# Altium footprint library SparkFun.PCBLIB: 674 footprints (part 43 of 44)
Each footprint in its own frame and in the unit in brackets; x right, y up, seen from the top. Pads: shape width x height; smd on the part's side, far side on the other; paste and mask are expansions set on the pad; w line width, h text height; cw(c..) or ccw(c..) is an arc to the next point about the centre after c.
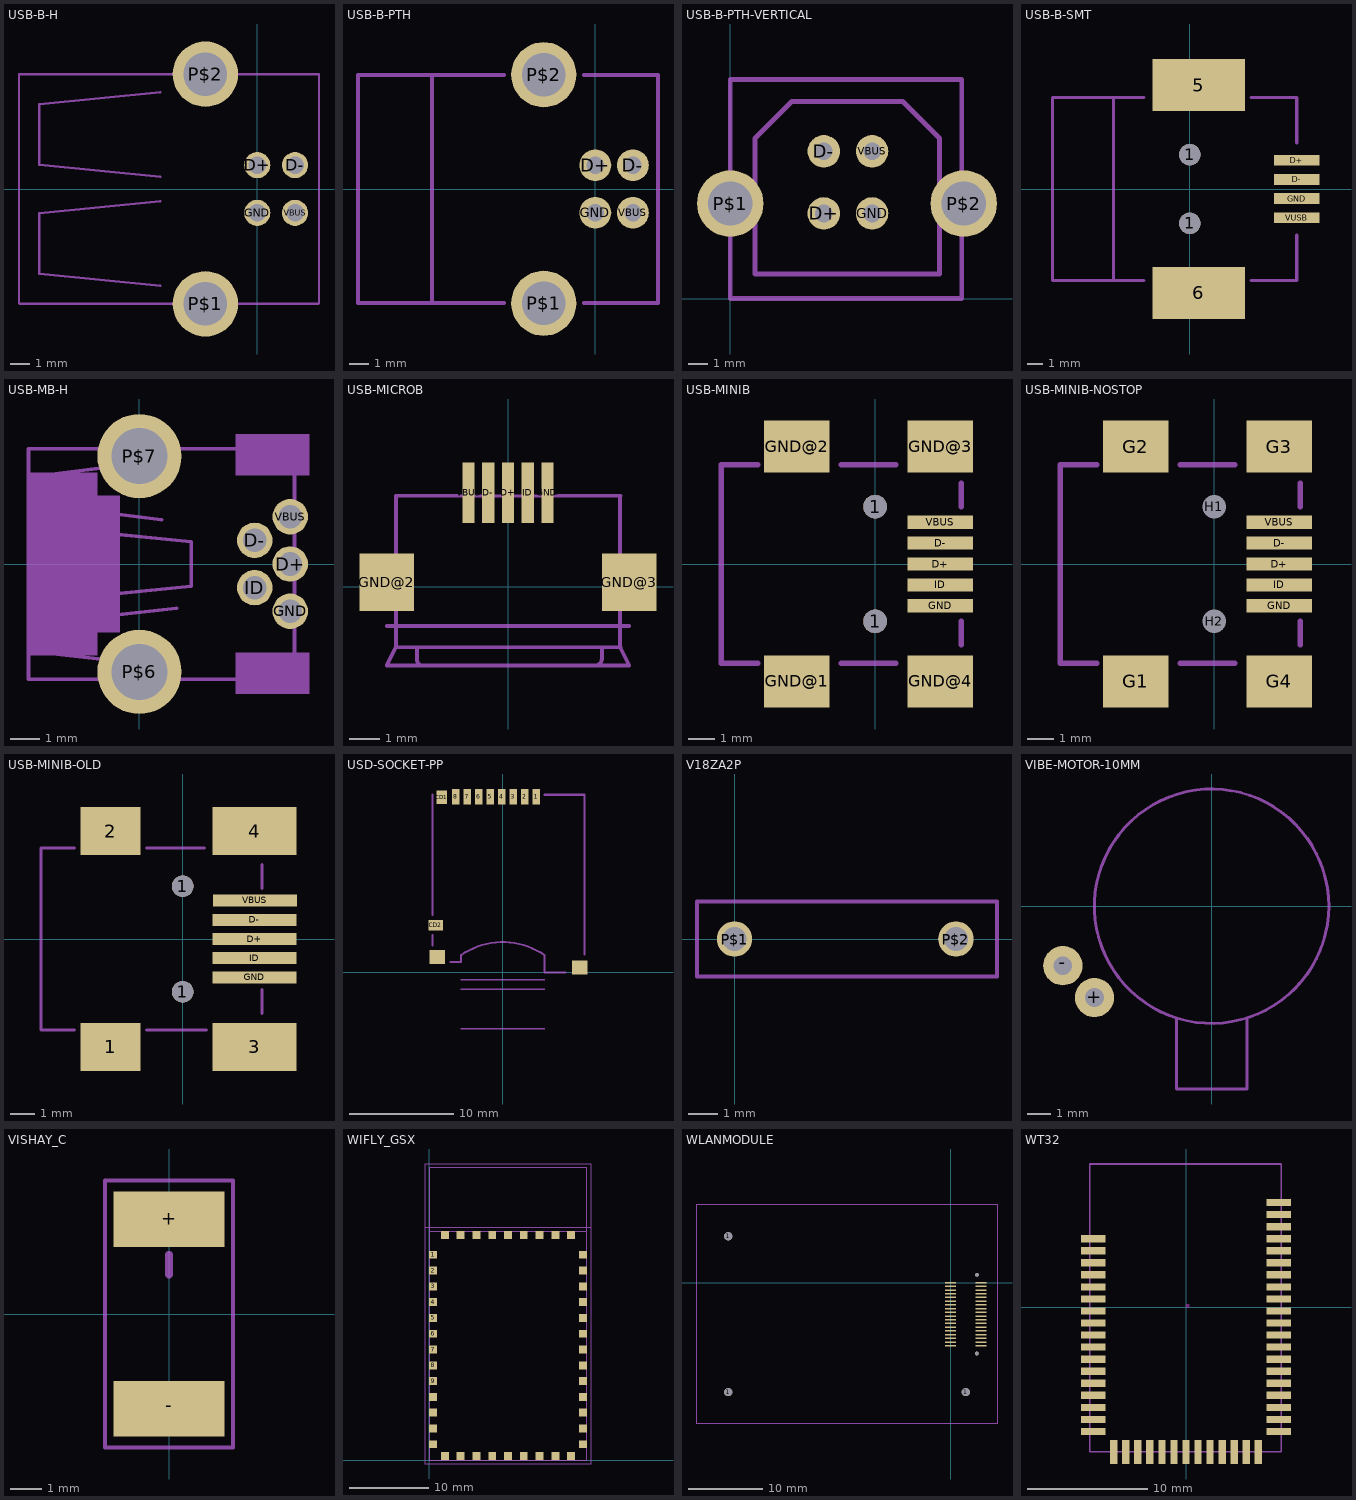
[diagram p42: the footprints below, top view; thin cyan lines are the x and y axes]

## USB-B-H [mil]
pads (6):
  round 54 hole 36: D+(0,49.21) D-(78,49.21) GND(0,-49.21) VBUS(78,-49.21)
  round 135 hole 90: P$1(-107,-237) P$2(-107,237)
Mechanical 2:
  lines w5: -491.57,-236.21 -491.57,236.79 ; -490.79,237 127.21,237 ; -489.79,-237 126.21,-237 ; -200,-200 -450,-175 -450,-50 -200,-25 ; -200,25 -450,50 -450,175 -200,200 ; 127.43,-236.21 127.43,236.79

## USB-B-PTH [mil]
pads (6):
  round 66 hole 36: D+(0,49.21) D-(78,49.21) GND(0,-49.21) VBUS(78,-49.21)
  round 135 hole 90: P$1(-107,-237) P$2(-107,237)
Mechanical 2:
  lines w8: -338.58,-236.22 -188.98,-236.22 ; -338.58,236.22 -188.98,236.22 ; -23.62,-236.22 129.92,-236.22 129.92,236.22 -23.62,236.22
Mechanical 18:
  lines w8: -492.13,-236.22 -338.58,-236.22 -338.58,236.22 -492.13,236.22 -492.13,-236.22

## USB-B-PTH-VERTICAL [mil]
pads (6):
  round 66 hole 36: D+(190,173) D-(190,299) GND(288,173) VBUS(288,299)
  round 135 hole 90: P$1(0,193) P$2(474,193)
Mechanical 2:
  lines w10: 0,0 470,0 470,445 0,445 0,0
Mechanical 18:
  lines w10: 50,50 425,50 425,325 350,400 125,400 50,325 50,50

## USB-B-SMT [mm]
pads (8):
  round 1.4 hole 1.4: 1(0,-2.25) 1(0,2.25)
  rect 6.04x3.4 smd: 5(0.58,6.8) 6(0.58,-6.8)
  rect 3x0.7 smd: D+(7,1.875) D-(7,0.625) GND(7,-0.625) VUSB(7,-1.875)
Mechanical 2:
  lines w0.203: -5,-6 -3,-6 ; -5,6 -3,6 ; 4,-6 7,-6 7,-3 ; 4,6 7,6 7,3
Mechanical 18:
  lines w0.203: -9,-6 -9,6 -5,6 -5,-6 -9,-6 ; -1,-7.3 -1,-6 2.4,-6 2.4,-7.3 2.2,-7.5 1.9,-7.5 1.4,-7 0,-7 -0.5,-7.5 -0.8,-7.5 -1,-7.3 ; -1,6 2.4,6 2.4,7.3 2.2,7.5 1.9,7.5 1.4,7 0,7 -0.5,7.5 -0.8,7.5 -1,7.3 -1,6

## USB-MB-H [mil]
pads (7):
  round 47.25 hole 31.5: D+(200.79,0) D-(153.54,31.5) GND(200.79,-62.99) ID(153.54,-31.5) VBUS(200.79,62.99)
  round 112.2 hole 74.8: P$6(0,-143.7) P$7(0,143.7)
Mechanical 3:
  lines w5: -127.95,-49.21 68.9,-29.53 68.9,29.53 -127.95,49.21 ; 29.53,59.06 -127.95,78.74 -127.95,118.11 29.53,137.8 ; 49.21,-137.8 -127.95,-118.11 -127.95,-78.74 49.21,-59.06 ; -147.64,-153.54 -147.64,153.54 206.69,153.54 206.69,-153.54 -147.64,-153.54
Mechanical 12:
  rectangle: 127.95,118.11 226.38,173.23
  rectangle: 127.95,-173.23 226.38,-118.11
  rectangle: -147.64,-122.05 -56.1,122.05
  rectangle: -56.1,-91.54 -25.59,91.54

## USB-MICROB [mm]
pads (7):
  rect 0.4x2 smd: D+(0,3.1) D-(-0.65,3.1) GND(1.3,3.1) ID(0.65,3.1) VBUS(-1.3,3.1)
  rect 1.8x1.9 smd: GND@2(-4,0.15) GND@3(4,0.15)
Mechanical 2:
  lines w0.127: -4,-2.595 -3.685,-1.965 ; -3.7,-0.97 -3.7,-2 -3,-2 ; -3.7,1.265 -3.7,3 -1.67,3 ; 0.025,-2.595 cw(c0.01,-2.585) 0,-2.6 ; 1.67,3 3.7,3 ; 3.69,-1.975 3.995,-2.595 ; 3.7,-0.97 3.7,-2 ; 3.7,1.27 3.7,3 ; 3.71,-1.995 3.7,-2 ; 3.71,3 3.7,3 ; -3,-2 3.1,-2 ; -3,-2 -3,-2.435 ccw(c-2.828,-2.428) -2.82,-2.6 0,-2.6 ; 0,-2.6 2.82,-2.6 ccw(c2.863,-2.362) 3.1,-2.405 3.1,-2 ; 3.1,-2 3.7,-2
Mechanical 18:
  lines w0.127: -4,-2.6 4,-2.6 ; -4,-1.3 4,-1.3 ; -3.7,-2 -3.7,3 3.7,2.985 ; 3.7,-2 3.7,3

## USB-MINIB [mm]
pads (11):
  round 0.9 hole 0.9: 1(0,-2.2) 1(0,2.2)
  rect 2.5x0.5 smd: D+(2.5,0) D-(2.5,0.8) GND(2.5,-1.6) ID(2.5,-0.8) VBUS(2.5,1.6)
  rect 2.5x2 smd: GND@1(-3,-4.5) GND@2(-3,4.5) GND@3(2.5,4.5) GND@4(2.5,-4.5)
Mechanical 2:
  lines w0.203: -1.3,-3.8 0.8,-3.8 ; -1.3,3.8 0.8,3.8 ; 3.3,-3.1 3.3,-2.2 ; 3.3,2.2 3.3,3.1
Mechanical 18:
  lines w0.203: -4.5,-3.8 -5.9,-3.8 -5.9,3.8 -4.5,3.8

## USB-MINIB-NOSTOP [mil]
pads (11):
  rect 98.43x19.69 smd: D+(98.43,0) D-(98.43,31.5) GND(98.43,-62.99) ID(98.43,-31.5) VBUS(98.43,62.99)
  rect 98.43x78.74 smd: G1(-118.11,-177.17) G2(-118.11,177.17) G3(98.43,177.17) G4(98.43,-177.17)
  round 31.5 hole 35.43: H1(0,86.61)
  round 31 hole 35.43: H2(0,-86.61)
Top Solder:
  circle w16.14: c0,86.61 r13.78
  circle w16.14: c0,-86.61 r13.78
Mechanical 2:
  lines w8: -51.18,-149.61 31.5,-149.61 ; -51.18,149.61 31.5,149.61 ; 129.92,-122.05 129.92,-86.61 ; 129.92,86.61 129.92,122.05
Mechanical 18:
  lines w8: -177.17,-149.61 -232.28,-149.61 -232.28,149.61 -177.17,149.61

## USB-MINIB-OLD [mm]
pads (11):
  rect 2.5x2 smd: 1(-3,-4.5) 2(-3,4.5)
  round 0.9 hole 0.9: 1(0,-2.2) 1(0,2.2)
  rect 3.5x2 smd: 3(3,-4.5) 4(3,4.5)
  rect 3.5x0.5 smd: D+(3,0) D-(3,0.8) GND(3,-1.6) ID(3,-0.8) VBUS(3.01,1.61)
Mechanical 2:
  lines w0.127: -1.5,-3.8 1,-3.8 ; -1.5,3.8 0.9,3.8 ; 3.3,-3.1 3.3,-2.1 ; 3.3,2.1 3.3,3.1
Mechanical 18:
  lines w0.127: -4.5,-3.8 -5.9,-3.8 -5.9,3.8 -4.5,3.8

## USD-SOCKET-PP [mm]
pads (12):
  rect 0.75x1.5 smd: 1(3.2,16.8) 2(2.1,16.8) 3(1,16.8) 4(-0.1,16.8) 5(-1.2,16.8) 6(-2.3,16.8) 7(-3.4,16.8) 8(-4.5,16.8)
  rect 1x1.3 smd: CD1(-5.85,16.75)
  rect 1.4x1 smd: CD2(-6.425,4.5)
  rect 1.5x1.35 smd: GND1(-6.275,1.475) GND2(7.375,0.475)
Mechanical 2:
  lines w0.203: -6.725,2.6 -6.725,3.6 ; -6.725,5.5 -6.725,17 ; -5,1 -4,1 -4,1.65 cw(c0,-4.125) 4,1.65 4,0 6,0 ; 4,17 7.825,17 7.825,1.7
Mechanical 18:
  lines w0.127: -4,-5.4 4,-5.4 ; -4,-1.6 4,-1.6 ; -4,-0.7 4,-0.7

## V18ZA2P [mil]
pads (2):
  round 47.25 hole 31.5: P$1(0,0) P$2(295.28,0)
Mechanical 2:
  lines w5: -50,-50 -50,50 350,50 350,-50 -50,-50

## VIBE-MOTOR-10MM [mil]
pads (2):
  round 66 hole 31.5: +(-196.85,-153.54) -(-250,-100)
Mechanical 18:
  circle w5: c0,0 r196.89
  lines w5: -59.06,-188.98 -59.06,-307.09 59.06,-307.09 59.06,-188.98

## VISHAY_C [mil]
pads (2):
  rect 140x70 smd: +(0,120) -(0,-120)
Mechanical 2:
  lines w5: -81,-169 -81,169 81,169 81,-169 -81,-169
  lines w10: 0,50 0,75

## WIFLY_GSX [mm]
pads (44):
  rect 1x1 smd: 1(0.5,26) 2(0.5,24) 3(0.5,22) 4(0.5,20) 5(0.5,18) 6(0.5,16) 7(0.5,14) 8(0.5,12) 9(0.5,10) 10(0.5,8) 11(0.5,6) 12(0.5,4) 13(0.5,2) 14(2,0.5) 15(4,0.5) 16(6,0.5) 17(8,0.5) 18(10,0.5) 19(12,0.5) 20(14,0.5) 21(16,0.5) 22(18,0.5) 23(19.5,2) 24(19.5,4) 25(19.5,6) 26(19.5,8) 27(19.5,10) 28(19.5,12) 29(19.5,14) 30(19.5,16) 31(19.5,18) 32(19.5,20) 33(19.5,22) 34(19.5,24) 35(19.5,26) 36(18,28.5) 37(16,28.5) 38(14,28.5) 39(12,28.5) 40(10,28.5) 41(8,28.5) 42(6,28.5) 43(4,28.5) 44(2,28.5)
Mechanical 2:
  lines w0.127: -0.5,29.5 -0.5,-0.5 20.5,-0.5 20.5,29.5 ; -0.5,29.5 -0.5,37.5 20.5,37.5 20.5,29.5 ; -0.5,29.5 20.5,29.5
Mechanical 18:
  lines w0.127: 0,29 0,37 20,37 20,29 ; 0,29 0,0 20,0 20,29 ; 0,29 20,29

## WLANMODULE [mm]
pads (41):
  round 1.1 hole 1.1: 1(-29.95,-14.75) 1(-29.95,6.25) 1(2.05,-14.75)
  round 0.5 hole 0.5: 1(3.54,-9.55) 1(3.55,1.05)
  rect 1.5x0.2 smd: P1(4.1,0) P2(0,0) P3(4.1,-0.5) P4(0,-0.5) P5(4.1,-1) P6(0,-1) P7(4.1,-1.5) P8(0,-1.5) P9(4.1,-2) P10(0,-2) P11(4.1,-2.5) P12(0,-2.5) P13(4.1,-3) P14(0,-3) P15(4.1,-3.5) P16(0,-3.5) P17(4.1,-4) P18(0,-4) P19(4.1,-4.5) P20(0,-4.5) P21(4.1,-5) P22(0,-5) P23(4.1,-5.5) P24(0,-5.5) P25(4.1,-6) P26(0,-6) P27(4.1,-6.5) P28(0,-6.5) P29(4.1,-7) P30(0,-7) P31(4.1,-7.5) P32(0,-7.5) P33(4.1,-8) P34(0,-8) P35(4.1,-8.5) P36(0,-8.5)
Mechanical 2:
  lines w0.127: -34.15,-19 6.25,-19 6.25,10.53 6.25,10.55 -34.15,10.55 -34.15,-19

## WT32 [mm]
pads (50):
  rect 2x0.6 smd: 1(-7.7,5.7) 2(-7.7,4.7) 3(-7.7,3.7) 4(-7.7,2.7) 5(-7.7,1.7) 6(-7.7,0.7) 7(-7.7,-0.3) 8(-7.7,-1.3) 9(-7.7,-2.3) 10(-7.7,-3.3) 11(-7.7,-4.3) 12(-7.7,-5.3) 13(-7.7,-6.3) 14(-7.7,-7.3) 15(-7.7,-8.3) 16(-7.7,-9.3) 17(-7.7,-10.3) 31(7.7,-10.3) 32(7.7,-9.3) 33(7.7,-8.3) 34(7.7,-7.3) 35(7.7,-6.3) 36(7.7,-5.3) 37(7.7,-4.3) 38(7.7,-3.3) 39(7.7,-2.3) 40(7.7,-1.3) 41(7.7,-0.3) 42(7.7,0.7) 43(7.7,1.7) 44(7.7,2.7) 45(7.7,3.7) 46(7.7,4.7) 47(7.7,5.7) 48(7.7,6.7) 49(7.7,7.7) 50(7.7,8.7)
  rect 0.6x2 smd: 18(-6,-12) 19(-5,-12) 20(-4,-12) 21(-3,-12) 22(-2,-12) 23(-1,-12) 24(0,-12) 25(1,-12) 26(2,-12) 27(3,-12) 28(4,-12) 29(5,-12) 30(6,-12)
Keep-Out Layer:
  region: 0,0 0.254,0 0.254,0.254 0,0.254
  region: 0,0 0.254,0 0.254,0.254 0,0.254
Mechanical 18:
  lines w0.127: -8,-12 7.9,-12 7.9,11.9 -8,11.9 -8,-12